# Altium footprint library Ultrascale_PcbLib.PcbLib: 132 footprints (part 5 of 9)
Each footprint in its own frame and in the unit in brackets; x right, y up, seen from the top. Pads: shape width x height; smd on the part's side, far side on the other; paste and mask are expansions set on the pad; w line width, h text height; cw(c..) or ccw(c..) is an arc to the next point about the centre after c.
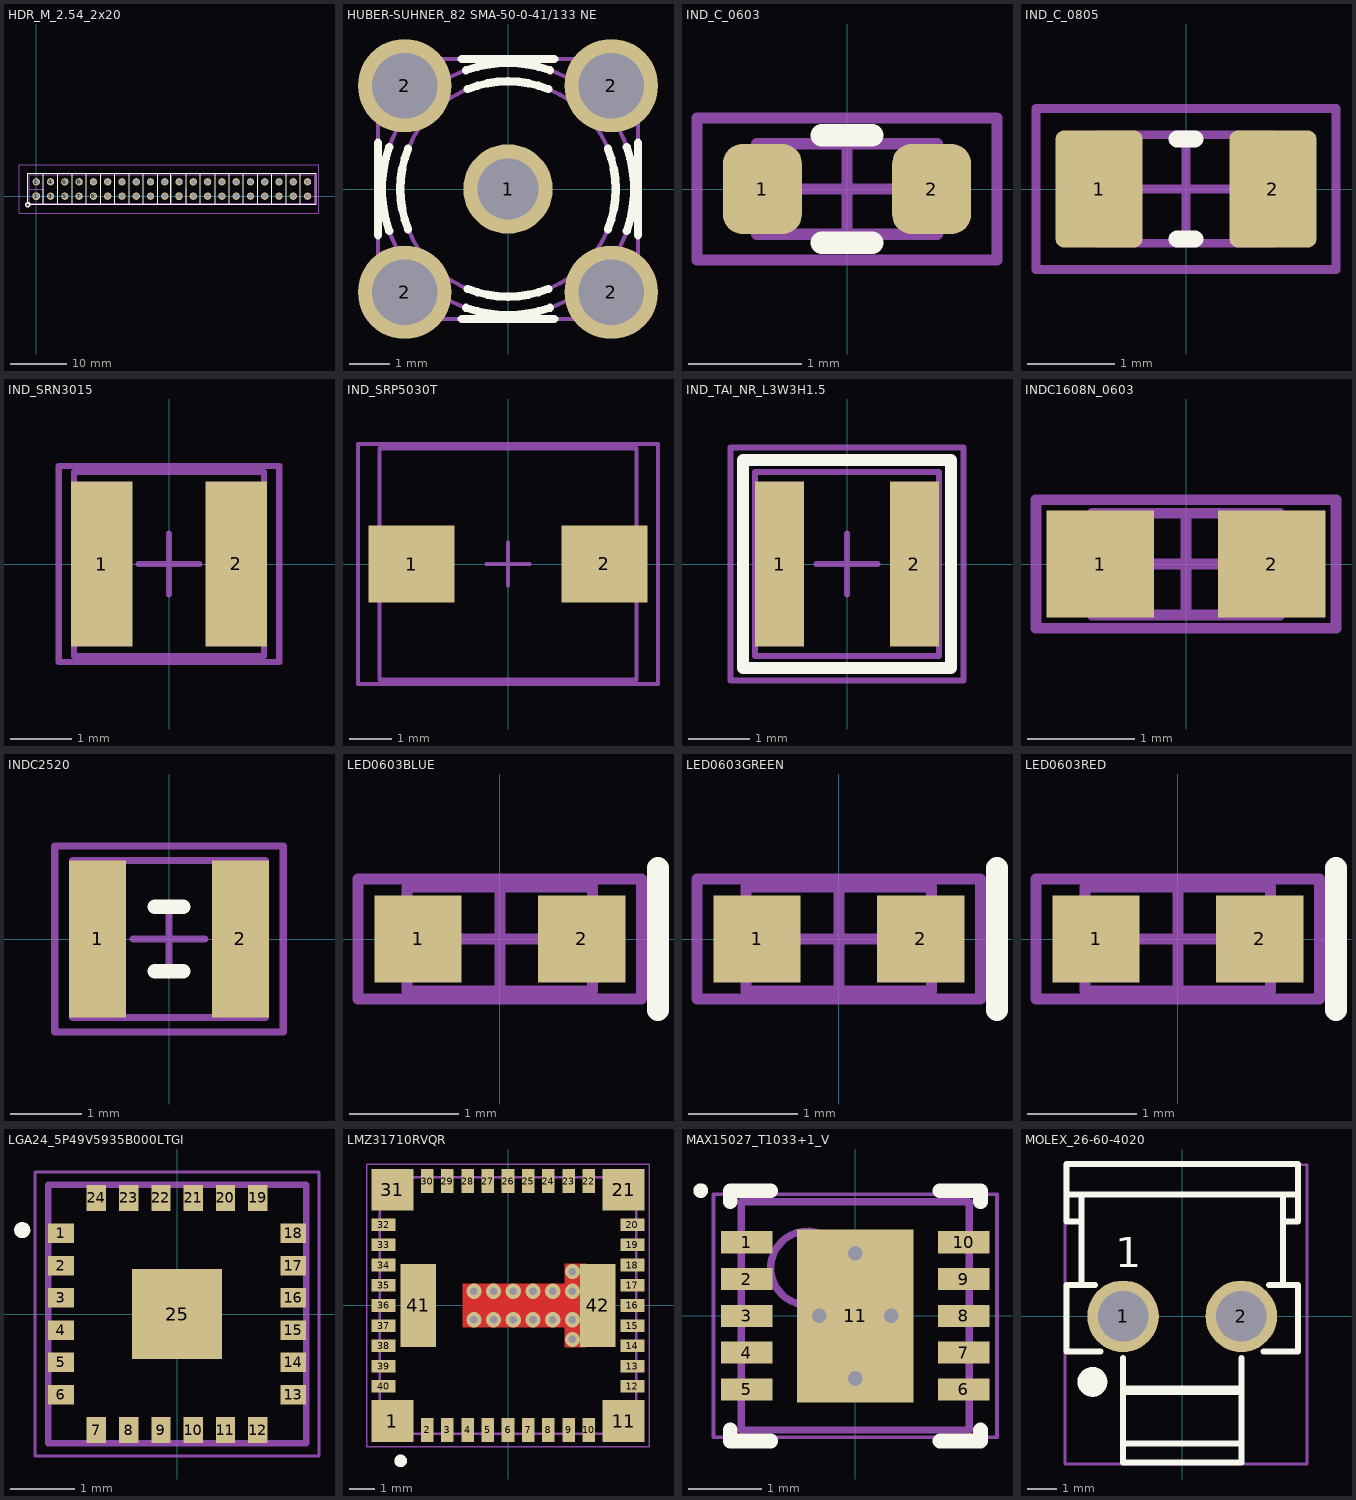
[diagram p4: the footprints below, top view; thin cyan lines are the x and y axes]

## HDR_M_2.54_2x20 [mil] "Header Male Vertical Dual Row 20 Way 2.54mm Pitch"
height 98.42
pads (40):
  oct 51x51 hole 36: 1(0,0) 21(1000,0)
  round 51 hole 36: 2(0,100) 3(100,0) 4(100,100) 5(200,0) 6(200,100) 7(300,0) 8(300,100) 9(400,0) 10(400,100) 11(500,0) 12(500,100) 13(600,0) 14(600,100) 15(700,0) 16(700,100) 17(800,0) 18(800,100) 19(900,0) 20(900,100) 22(1000,100) 23(1100,0) 24(1100,100) 25(1200,0) 26(1200,100) 27(1300,0) 28(1300,100) 29(1400,0) 30(1400,100) 31(1500,0) 32(1500,100) 33(1600,0) 34(1600,100) 35(1700,0) 36(1700,100) 37(1800,0) 38(1800,100) 39(1900,0) 40(1900,100)
Top Overlay:
  circle w10: c-60,-60 r14.33
  lines w7.87: 50,-55 50,155 ; 150,-55 150,155 ; 250,-55 250,155 ; 350,-55 350,155 ; 450,-55 450,155 ; 550,-55 550,155 ; 650,-55 650,155 ; 750,-55 750,158 ; 850,-55 850,158 ; 960,-57.5 -45,-57.5 -60,-42.5 -60,159.5 960,159.5 ; 1050,-55 1050,155 ; 1150,-55 1150,155 ; 1250,-55 1250,155 ; 1350,-55 1350,155 ; 1450,-55 1450,155 ; 1550,-55 1550,155 ; 1650,-55 1650,155 ; 1750,-55 1750,158 ; 1850,-55 1850,158 ; 940,-57.5 1960,-57.5 1960,159.5 940,159.5 940,-57.5
Mechanical 11:
  circle w5.91: c-55,-55 r7
  lines w3.94: -50,50 50,50 50,-50 ; -50,149 -50,-49 950,-49 ; -50,149.5 950,149.5 1950,149.5 ; 1050,-50 1050,50 ; 1950,149 1950,-49 950,-49 ; 950,-49 950,149 950,-49
Mechanical 15:
  lines w3.94: -121.06,220 -121.06,-120.08 1980,-120.08 1980,220.08 -121.06,220.08 ; -19.68,0 19.68,0 ; 0,-19.68 0,19.68 ; 980.32,0 1019.68,0 ; 1000,-19.68 1000,19.68
3D body: height 330, standoff 320, extent 1495,87.5 1505,97.5
3D body: height 330, standoff 320, extent 1487.5,95 1497.5,105
3D body: height 330, standoff 320, extent 1495,102.5 1505,112.5
3D body: height 330, standoff 320, extent 1502.5,95 1512.5,105
3D body: height 330, standoff 320, extent 1495,95 1505,105
3D body: height 320, standoff -130, extent 1487.5,87.5 1512.5,112.5
3D body: height 330, standoff 320, extent 1595,87.5 1605,97.5
3D body: height 330, standoff 320, extent 1587.5,95 1597.5,105
3D body: height 330, standoff 320, extent 1595,102.5 1605,112.5
3D body: height 330, standoff 320, extent 1602.5,95 1612.5,105
3D body: height 330, standoff 320, extent 1595,95 1605,105
3D body: height 320, standoff -130, extent 1587.5,87.5 1612.5,112.5
3D body: height 330, standoff 320, extent 1695,87.5 1705,97.5
3D body: height 330, standoff 320, extent 1687.5,95 1697.5,105
3D body: height 330, standoff 320, extent 1695,102.5 1705,112.5
3D body: height 330, standoff 320, extent 1702.5,95 1712.5,105
3D body: height 330, standoff 320, extent 1695,95 1705,105
3D body: height 320, standoff -130, extent 1687.5,87.5 1712.5,112.5
3D body: height 330, standoff 320, extent 1795,87.5 1805,97.5
3D body: height 330, standoff 320, extent 1787.5,95 1797.5,105
3D body: height 330, standoff 320, extent 1795,102.5 1805,112.5
3D body: height 330, standoff 320, extent 1802.5,95 1812.5,105
3D body: height 330, standoff 320, extent 1795,95 1805,105
3D body: height 320, standoff -130, extent 1787.5,87.5 1812.5,112.5
3D body: height 330, standoff 320, extent 1895,87.5 1905,97.5
3D body: height 330, standoff 320, extent 1887.5,95 1897.5,105
3D body: height 330, standoff 320, extent 1895,102.5 1905,112.5
3D body: height 330, standoff 320, extent 1902.5,95 1912.5,105
3D body: height 330, standoff 320, extent 1895,95 1905,105
3D body: height 320, standoff -130, extent 1887.5,87.5 1912.5,112.5
3D body: height 330, standoff 320, extent 995,87.5 1005,97.5
3D body: height 330, standoff 320, extent 987.5,95 997.5,105
3D body: height 330, standoff 320, extent 995,102.5 1005,112.5
3D body: height 330, standoff 320, extent 1002.5,95 1012.5,105
3D body: height 330, standoff 320, extent 995,95 1005,105
3D body: height 320, standoff -130, extent 987.5,87.5 1012.5,112.5
3D body: height 330, standoff 320, extent 1095,87.5 1105,97.5
3D body: height 330, standoff 320, extent 1087.5,95 1097.5,105
3D body: height 330, standoff 320, extent 1095,102.5 1105,112.5
3D body: height 330, standoff 320, extent 1102.5,95 1112.5,105
3D body: height 330, standoff 320, extent 1095,95 1105,105
3D body: height 320, standoff -130, extent 1087.5,87.5 1112.5,112.5
3D body: height 330, standoff 320, extent 1195,87.5 1205,97.5
3D body: height 330, standoff 320, extent 1187.5,95 1197.5,105
3D body: height 330, standoff 320, extent 1195,102.5 1205,112.5
3D body: height 330, standoff 320, extent 1202.5,95 1212.5,105
3D body: height 330, standoff 320, extent 1195,95 1205.01,105
3D body: height 320, standoff -130, extent 1187.5,87.5 1212.5,112.5
3D body: height 330, standoff 320, extent 1295,87.5 1305,97.5
3D body: height 330, standoff 320, extent 1287.5,95 1297.5,105
3D body: height 330, standoff 320, extent 1295,102.5 1305,112.5
3D body: height 330, standoff 320, extent 1302.5,95 1312.5,105
3D body: height 330, standoff 320, extent 1295,95 1305,105
3D body: height 320, standoff -130, extent 1287.5,87.5 1312.5,112.5
3D body: height 330, standoff 320, extent 1395,87.5 1405,97.5
3D body: height 330, standoff 320, extent 1387.5,95 1397.5,105
3D body: height 330, standoff 320, extent 1395,102.5 1405,112.5
3D body: height 330, standoff 320, extent 1402.5,95 1412.5,105
3D body: height 330, standoff 320, extent 1395,95 1405,105
3D body: height 320, standoff -130, extent 1387.5,87.5 1412.5,112.5
3D body: height 25, standoff 0, extent 1450,51 1475,149
3D body: height 100, standoff 25, extent 1450,50 1550.01,149
3D body: height 25, standoff 0, extent 1525,51 1550,149
3D body: height 25, standoff 0, extent 1550,51 1575,149
3D body: height 100, standoff 25, extent 1550,50 1650.01,149
3D body: height 25, standoff 0, extent 1625.01,51 1650,149
3D body: height 25, standoff 0, extent 1650,51 1675,149
3D body: height 100, standoff 25, extent 1650,50 1750.01,149
3D body: height 25, standoff 0, extent 1725.01,51 1750,149
3D body: height 25, standoff 0, extent 1750,51 1775,149
3D body: height 100, standoff 25, extent 1750,50 1850.01,149
3D body: height 25, standoff 0, extent 1825.01,51 1850,149
3D body: height 25, standoff 0, extent 1850,51 1875,149
3D body: height 100, standoff 25, extent 1850,50 1950.01,149
3D body: height 25, standoff 0, extent 1925.01,51 1950,149
3D body: height 25, standoff 0, extent 950,51 975,149
3D body: height 100, standoff 25, extent 950,50 1050.01,149
3D body: height 25, standoff 0, extent 1025.01,51 1050,149
3D body: height 25, standoff 0, extent 1050,51 1075,149
3D body: height 100, standoff 25, extent 1050,50 1150.01,149
3D body: height 25, standoff 0, extent 1125.01,51 1150,149
3D body: height 25, standoff 0, extent 1150,51 1175,149
3D body: height 100, standoff 25, extent 1150,50 1250.01,149
3D body: height 25, standoff 0, extent 1225.01,51 1250,149
3D body: height 25, standoff 0, extent 1250,51 1275,149
3D body: height 100, standoff 25, extent 1250,50 1350.01,149
3D body: height 25, standoff 0, extent 1325.01,51 1350,149
3D body: height 25, standoff 0, extent 1350,51 1375,149
3D body: height 100, standoff 25, extent 1350,50 1450.01,149
3D body: height 25, standoff 0, extent 1425.01,51 1450,149
3D body: height 330, standoff 320, extent 1495,-12.5 1505,-2.5
3D body: height 330, standoff 320, extent 1487.5,-5 1497.5,5
3D body: height 330, standoff 320, extent 1495,2.5 1505,12.5
3D body: height 330, standoff 320, extent 1502.5,-5 1512.5,5
3D body: height 330, standoff 320, extent 1495,-5 1505,5
3D body: height 25, standoff 0, extent 1450,-49 1475,49
3D body: height 100, standoff 25, extent 1450,-48.99 1550.01,50
3D body: height 25, standoff 0, extent 1525,-49 1550,49
3D body: height 320, standoff -130, extent 1487.5,-12.5 1512.5,12.5
3D body: height 330, standoff 320, extent 1595,-12.5 1605,-2.5
3D body: height 330, standoff 320, extent 1587.5,-5 1597.5,5
3D body: height 330, standoff 320, extent 1595,2.5 1605,12.5
3D body: height 330, standoff 320, extent 1602.5,-5 1612.5,5
3D body: height 330, standoff 320, extent 1595,-5 1605,5
3D body: height 25, standoff 0, extent 1550,-49 1575,49
3D body: height 100, standoff 25, extent 1550,-48.99 1650.01,50
3D body: height 25, standoff 0, extent 1625,-49 1650,49
3D body: height 320, standoff -130, extent 1587.5,-12.5 1612.5,12.5
3D body: height 330, standoff 320, extent 1695,-12.5 1705,-2.5
3D body: height 330, standoff 320, extent 1687.5,-5 1697.5,5
3D body: height 330, standoff 320, extent 1695,2.5 1705,12.5
3D body: height 330, standoff 320, extent 1702.5,-5 1712.5,5
3D body: height 330, standoff 320, extent 1695,-5 1705,5
3D body: height 25, standoff 0, extent 1650,-49 1675,49
3D body: height 100, standoff 25, extent 1650,-48.99 1750.01,50
3D body: height 25, standoff 0, extent 1725,-49 1750,49
3D body: height 320, standoff -130, extent 1687.5,-12.5 1712.5,12.5
3D body: height 330, standoff 320, extent 1795,-12.5 1805,-2.5
3D body: height 330, standoff 320, extent 1787.5,-5 1797.5,5
3D body: height 330, standoff 320, extent 1795,2.5 1805,12.5
3D body: height 330, standoff 320, extent 1802.5,-5 1812.5,5
3D body: height 330, standoff 320, extent 1795,-5 1805,5
3D body: height 25, standoff 0, extent 1750,-49 1775,49
3D body: height 100, standoff 25, extent 1750,-48.99 1850.01,50
3D body: height 25, standoff 0, extent 1825,-49 1850,49
3D body: height 320, standoff -130, extent 1787.5,-12.5 1812.5,12.5
3D body: height 330, standoff 320, extent 1895,-12.5 1905,-2.5
3D body: height 330, standoff 320, extent 1887.5,-5 1897.5,5
3D body: height 330, standoff 320, extent 1895,2.5 1905,12.5
3D body: height 330, standoff 320, extent 1902.5,-5 1912.5,5
3D body: height 330, standoff 320, extent 1895,-5 1905,5
3D body: height 25, standoff 0, extent 1850,-49 1875,49
3D body: height 100, standoff 25, extent 1850,-48.99 1950.01,50
3D body: height 25, standoff 0, extent 1925,-49 1950,49
3D body: height 320, standoff -130, extent 1887.5,-12.5 1912.5,12.5
3D body: height 330, standoff 320, extent 995,-12.5 1005,-2.5
3D body: height 330, standoff 320, extent 987.5,-5 997.5,5
3D body: height 330, standoff 320, extent 995,2.5 1005,12.5
3D body: height 330, standoff 320, extent 1002.5,-5 1012.5,5
3D body: height 330, standoff 320, extent 995,-5 1005,5
3D body: height 25, standoff 0, extent 950,-49 975,49
3D body: height 100, standoff 25, extent 950,-48.99 1050.01,50
3D body: height 25, standoff 0, extent 1025,-49 1050,49
3D body: height 320, standoff -130, extent 987.5,-12.5 1012.5,12.5
3D body: height 330, standoff 320, extent 1095,-12.5 1105,-2.5
3D body: height 330, standoff 320, extent 1087.5,-5 1097.5,5
3D body: height 330, standoff 320, extent 1095,2.5 1105,12.5
3D body: height 330, standoff 320, extent 1102.5,-5 1112.5,5
3D body: height 330, standoff 320, extent 1095,-5 1105,5
3D body: height 25, standoff 0, extent 1050,-49 1075,49
3D body: height 100, standoff 25, extent 1050,-48.99 1150.01,50
3D body: height 25, standoff 0, extent 1125,-49 1150,49
3D body: height 320, standoff -130, extent 1087.5,-12.5 1112.5,12.5
3D body: height 330, standoff 320, extent 1195,-12.5 1205,-2.5
3D body: height 330, standoff 320, extent 1187.5,-5 1197.5,5
3D body: height 330, standoff 320, extent 1195,2.5 1205,12.5
3D body: height 330, standoff 320, extent 1202.5,-5 1212.5,5
3D body: height 330, standoff 320, extent 1195,-5 1205,5
3D body: height 25, standoff 0, extent 1150,-49 1175,49
3D body: height 100, standoff 25, extent 1150,-48.99 1250.01,50
3D body: height 25, standoff 0, extent 1225,-49 1250,49
3D body: height 320, standoff -130, extent 1187.5,-12.5 1212.5,12.5
3D body: height 330, standoff 320, extent 1295,-12.5 1305,-2.5
3D body: height 330, standoff 320, extent 1287.5,-5 1297.5,5
3D body: height 330, standoff 320, extent 1295,2.5 1305,12.5
3D body: height 330, standoff 320, extent 1302.5,-5 1312.5,5
3D body: height 330, standoff 320, extent 1295,-5 1305,5
3D body: height 25, standoff 0, extent 1250,-49 1275,49
3D body: height 100, standoff 25, extent 1250,-48.99 1350.01,50
3D body: height 25, standoff 0, extent 1325,-49 1350,49
3D body: height 320, standoff -130, extent 1287.5,-12.5 1312.5,12.5
3D body: height 330, standoff 320, extent 1395,-12.5 1405,-2.5
3D body: height 330, standoff 320, extent 1387.5,-5 1397.5,5
3D body: height 330, standoff 320, extent 1395,2.5 1405,12.5
3D body: height 330, standoff 320, extent 1402.5,-5 1412.5,5
3D body: height 330, standoff 320, extent 1395,-5 1405,5
3D body: height 25, standoff 0, extent 1350,-49 1375,49
3D body: height 100, standoff 25, extent 1350,-48.99 1450.01,50
3D body: height 25, standoff 0, extent 1425,-49 1450,49
3D body: height 320, standoff -130, extent 1387.5,-12.5 1412.5,12.5
3D body: height 320, standoff -130, extent 387.5,-12.5 412.5,12.5
3D body: height 25, standoff 0, extent 425,-49 450,49
3D body: height 100, standoff 25, extent 350,-48.99 450.01,50
3D body: height 25, standoff 0, extent 350,-49 375,49
3D body: height 330, standoff 320, extent 395,-5 405,5
3D body: height 330, standoff 320, extent 402.5,-5 412.5,5
3D body: height 330, standoff 320, extent 395,2.5 405,12.5
3D body: height 330, standoff 320, extent 387.5,-5 397.5,5
3D body: height 330, standoff 320, extent 395,-12.5 405,-2.5
3D body: height 320, standoff -130, extent 287.5,-12.5 312.5,12.5
3D body: height 25, standoff 0, extent 325,-49 350,49
3D body: height 100, standoff 25, extent 250,-48.99 350.01,50
3D body: height 25, standoff 0, extent 250,-49 275,49
3D body: height 330, standoff 320, extent 295,-5 305,5
3D body: height 330, standoff 320, extent 302.5,-5 312.5,5
3D body: height 330, standoff 320, extent 295,2.5 305,12.5
3D body: height 330, standoff 320, extent 287.5,-5 297.5,5
3D body: height 330, standoff 320, extent 295,-12.5 305,-2.5
3D body: height 320, standoff -130, extent 187.5,-12.5 212.5,12.5
3D body: height 25, standoff 0, extent 225,-49 250,49
3D body: height 100, standoff 25, extent 150,-48.99 250.01,50
3D body: height 25, standoff 0, extent 150,-49 175,49
3D body: height 330, standoff 320, extent 195,-5 205,5
3D body: height 330, standoff 320, extent 202.5,-5 212.5,5
3D body: height 330, standoff 320, extent 195,2.5 205,12.5
3D body: height 330, standoff 320, extent 187.5,-5 197.5,5
3D body: height 330, standoff 320, extent 195,-12.5 205,-2.5
3D body: height 320, standoff -130, extent 87.5,-12.5 112.5,12.5
3D body: height 25, standoff 0, extent 125,-49 150,49
3D body: height 100, standoff 25, extent 50,-48.99 150.01,50
3D body: height 25, standoff 0, extent 50,-49 75,49
3D body: height 330, standoff 320, extent 95,-5 105,5
3D body: height 330, standoff 320, extent 102.5,-5 112.5,5
3D body: height 330, standoff 320, extent 95,2.5 105,12.5
3D body: height 330, standoff 320, extent 87.5,-5 97.5,5
3D body: height 330, standoff 320, extent 95,-12.5 105,-2.5
3D body: height 320, standoff -130, extent -12.5,-12.5 12.5,12.5
3D body: height 25, standoff 0, extent 25,-49 50,49
3D body: height 100, standoff 25, extent -50,-48.99 50.01,50
3D body: height 25, standoff 0, extent -50,-49 -25,49
3D body: height 330, standoff 320, extent -5,-5 5,5
3D body: height 330, standoff 320, extent 2.5,-5 12.5,5
3D body: height 330, standoff 320, extent -5,2.5 5,12.5
3D body: height 330, standoff 320, extent -12.5,-5 -2.5,5
3D body: height 330, standoff 320, extent -5,-12.5 5,-2.5
3D body: height 320, standoff -130, extent 887.5,-12.5 912.5,12.5
3D body: height 25, standoff 0, extent 925,-49 950,49
3D body: height 100, standoff 25, extent 850,-48.99 950.01,50
3D body: height 25, standoff 0, extent 850,-49 875,49
3D body: height 330, standoff 320, extent 895,-5 905,5
3D body: height 330, standoff 320, extent 902.5,-5 912.5,5
3D body: height 330, standoff 320, extent 895,2.5 905,12.5
3D body: height 330, standoff 320, extent 887.5,-5 897.5,5
3D body: height 330, standoff 320, extent 895,-12.5 905,-2.5
3D body: height 320, standoff -130, extent 787.5,-12.5 812.5,12.5
3D body: height 25, standoff 0, extent 825,-49 850,49
3D body: height 100, standoff 25, extent 750,-48.99 850.01,50
3D body: height 25, standoff 0, extent 750,-49 775,49
3D body: height 330, standoff 320, extent 795,-5 805,5
3D body: height 330, standoff 320, extent 802.5,-5 812.5,5
3D body: height 330, standoff 320, extent 795,2.5 805,12.5
3D body: height 330, standoff 320, extent 787.5,-5 797.5,5
3D body: height 330, standoff 320, extent 795,-12.5 805,-2.5
3D body: height 320, standoff -130, extent 687.5,-12.5 712.5,12.5
3D body: height 25, standoff 0, extent 725,-49 750,49
3D body: height 100, standoff 25, extent 650,-48.99 750.01,50
3D body: height 25, standoff 0, extent 650,-49 675,49
3D body: height 330, standoff 320, extent 695,-5 705,5
3D body: height 330, standoff 320, extent 702.5,-5 712.5,5
3D body: height 330, standoff 320, extent 695,2.5 705,12.5
3D body: height 330, standoff 320, extent 687.5,-5 697.5,5
3D body: height 330, standoff 320, extent 695,-12.5 705,-2.5
3D body: height 320, standoff -130, extent 587.5,-12.5 612.5,12.5
3D body: height 25, standoff 0, extent 625,-49 650,49
3D body: height 100, standoff 25, extent 550,-48.99 650.01,50
3D body: height 25, standoff 0, extent 550,-49 575,49
3D body: height 330, standoff 320, extent 595,-5 605,5
3D body: height 330, standoff 320, extent 602.5,-5 612.5,5
3D body: height 330, standoff 320, extent 595,2.5 605,12.5
3D body: height 330, standoff 320, extent 587.5,-5 597.5,5
3D body: height 330, standoff 320, extent 595,-12.5 605,-2.5
3D body: height 320, standoff -130, extent 487.5,-12.5 512.5,12.5
3D body: height 25, standoff 0, extent 525,-49 550,49
3D body: height 100, standoff 25, extent 450,-48.99 550.01,50
3D body: height 25, standoff 0, extent 450,-49 475,49
3D body: height 330, standoff 320, extent 495,-5 505,5
3D body: height 330, standoff 320, extent 502.5,-5 512.5,5
3D body: height 330, standoff 320, extent 495,2.5 505,12.5
3D body: height 330, standoff 320, extent 487.5,-5 497.5,5
3D body: height 330, standoff 320, extent 495,-12.5 505,-2.5
3D body: height 25, standoff 0, extent 425,51 450,149
3D body: height 100, standoff 25, extent 350,50 450.01,149
3D body: height 25, standoff 0, extent 350,51 375,149
3D body: height 25, standoff 0, extent 325,51 350,149
3D body: height 100, standoff 25, extent 250,50 350.01,149
3D body: height 25, standoff 0, extent 250,51 275,149
3D body: height 25, standoff 0, extent 225,51 250,149
3D body: height 100, standoff 25, extent 150,50 250.01,149
3D body: height 25, standoff 0, extent 150,51 175,149
3D body: height 25, standoff 0, extent 125,51 150,149
3D body: height 100, standoff 25, extent 50,50 150.01,149
3D body: height 25, standoff 0, extent 50,51 75,149
3D body: height 25, standoff 0, extent 25,51 50,149
3D body: height 100, standoff 25, extent -50,50 50.01,149
3D body: height 25, standoff 0, extent -50,51 -25,149
3D body: height 25, standoff 0, extent 925,51 950,149
3D body: height 100, standoff 25, extent 850,50 950.01,149
3D body: height 25, standoff 0, extent 850,51 875,149
3D body: height 25, standoff 0, extent 825,51 850,149
3D body: height 100, standoff 25, extent 750,50 850.01,149
3D body: height 25, standoff 0, extent 750,51 775,149
3D body: height 25, standoff 0, extent 725,51 750,149
3D body: height 100, standoff 25, extent 650,50 750.01,149
3D body: height 25, standoff 0, extent 650,51 675,149
3D body: height 25, standoff 0, extent 625,51 650,149
3D body: height 100, standoff 25, extent 550,50 650.01,149
3D body: height 25, standoff 0, extent 550,51 575,149
3D body: height 25, standoff 0, extent 525,51 550,149
3D body: height 100, standoff 25, extent 450,50 550.01,149
3D body: height 25, standoff 0, extent 450,51 475,149
3D body: height 320, standoff -130, extent 387.5,87.5 412.5,112.5
3D body: height 330, standoff 320, extent 395,95 405,105
3D body: height 330, standoff 320, extent 402.5,95 412.5,105
3D body: height 330, standoff 320, extent 395,102.5 405,112.5
3D body: height 330, standoff 320, extent 387.5,95 397.5,105
3D body: height 330, standoff 320, extent 395,87.5 405,97.5
3D body: height 320, standoff -130, extent 287.5,87.5 312.5,112.5
3D body: height 330, standoff 320, extent 295,95 305,105
3D body: height 330, standoff 320, extent 302.5,95 312.5,105
3D body: height 330, standoff 320, extent 295,102.5 305,112.5
3D body: height 330, standoff 320, extent 287.5,95 297.5,105
3D body: height 330, standoff 320, extent 295,87.5 305,97.5
3D body: height 320, standoff -130, extent 187.5,87.5 212.5,112.5
3D body: height 330, standoff 320, extent 195,95 205,105
3D body: height 330, standoff 320, extent 202.5,95 212.5,105
3D body: height 330, standoff 320, extent 195,102.5 205,112.5
3D body: height 330, standoff 320, extent 187.5,95 197.5,105
3D body: height 330, standoff 320, extent 195,87.5 205,97.5
3D body: height 320, standoff -130, extent 87.5,87.5 112.5,112.5
3D body: height 330, standoff 320, extent 95,95 105,105
3D body: height 330, standoff 320, extent 102.5,95 112.5,105
3D body: height 330, standoff 320, extent 95,102.5 105,112.5
3D body: height 330, standoff 320, extent 87.5,95 97.5,105
3D body: height 330, standoff 320, extent 95,87.5 105,97.5
3D body: height 320, standoff -130, extent -12.5,87.5 12.5,112.5
3D body: height 330, standoff 320, extent -5,95 5,105
3D body: height 330, standoff 320, extent 2.5,95 12.5,105
3D body: height 330, standoff 320, extent -5,102.5 5,112.5
3D body: height 330, standoff 320, extent -12.5,95 -2.5,105
3D body: height 330, standoff 320, extent -5,87.5 5,97.5
3D body: height 320, standoff -130, extent 887.5,87.5 912.5,112.5
3D body: height 330, standoff 320, extent 895,95 905,105
3D body: height 330, standoff 320, extent 902.5,95 912.5,105
3D body: height 330, standoff 320, extent 895,102.5 905,112.5
3D body: height 330, standoff 320, extent 887.5,95 897.5,105
3D body: height 330, standoff 320, extent 895,87.5 905,97.5
3D body: height 320, standoff -130, extent 787.5,87.5 812.5,112.5
3D body: height 330, standoff 320, extent 795,95 805,105
3D body: height 330, standoff 320, extent 802.5,95 812.5,105
3D body: height 330, standoff 320, extent 795,102.5 805,112.5
3D body: height 330, standoff 320, extent 787.5,95 797.5,105
3D body: height 330, standoff 320, extent 795,87.5 805,97.5
3D body: height 320, standoff -130, extent 687.5,87.5 712.5,112.5
3D body: height 330, standoff 320, extent 695,95 705,105
3D body: height 330, standoff 320, extent 702.5,95 712.5,105
3D body: height 330, standoff 320, extent 695,102.5 705,112.5
3D body: height 330, standoff 320, extent 687.5,95 697.5,105
3D body: height 330, standoff 320, extent 695,87.5 705,97.5
3D body: height 320, standoff -130, extent 587.5,87.5 612.5,112.5
3D body: height 330, standoff 320, extent 595,95 605,105
3D body: height 330, standoff 320, extent 602.5,95 612.5,105
3D body: height 330, standoff 320, extent 595,102.5 605,112.5
3D body: height 330, standoff 320, extent 587.5,95 597.5,105
3D body: height 330, standoff 320, extent 595,87.5 605,97.5
3D body: height 320, standoff -130, extent 487.5,87.5 512.5,112.5
3D body: height 330, standoff 320, extent 495,95 505,105
3D body: height 330, standoff 320, extent 502.5,95 512.5,105
3D body: height 330, standoff 320, extent 495,102.5 505,112.5
3D body: height 330, standoff 320, extent 487.5,95 497.5,105
3D body: height 330, standoff 320, extent 495,87.5 505,97.5

## HUBER-SUHNER_82 SMA-50-0-41/133 NE [mm] "50 Ohm SMA Straight PCB Jack"
height 9.5
pads (5):
  round 2.2 hole 1.5: 1(0,0)
  round 2.3 hole 1.6: 2(-2.54,-2.54) 2(-2.54,2.54) 2(2.54,-2.54) 2(2.54,2.54)
Top Overlay:
  lines w0.2: -3.2,-1.138 -3.2,1.138 ; -2.921,-1.038 cw(c0,0) -2.921,1.038 ; -2.457,-0.992 cw(c0,0) -2.457,0.992 ; -1.138,-3.2 1.138,-3.2 ; -1.138,3.2 1.138,3.2 ; -1.038,-2.921 ccw(c0,0) 1.038,-2.921 ; -1.038,2.921 cw(c0,0) 1.038,2.921 ; -0.992,-2.457 ccw(c0,0) 0.992,-2.457 ; -0.992,2.457 cw(c0,0) 0.992,2.457 ; 2.457,-0.992 ccw(c0,0) 2.457,0.992 ; 2.921,-1.038 ccw(c0,0) 2.921,1.038 ; 3.2,-1.138 3.2,1.138
Mechanical 8:
  lines w0.1: -3.54,-2.54 -2.54,-2.54 ; -3.54,2.54 -2.54,2.54 ; -2.54,-3.54 -2.54,-2.54 ; -2.54,-1.54 -2.54,-2.54 ; -2.54,1.54 -2.54,2.54 ; -2.54,3.54 -2.54,2.54 ; -1.54,-2.54 -2.54,-2.54 ; -1.54,2.54 -2.54,2.54 ; -1,0 0,0 ; 0,-1 0,0 ; 0,1 0,0 ; 1,0 0,0 ; 1.54,-2.54 2.54,-2.54 ; 1.54,2.54 2.54,2.54 ; 2.54,-3.54 2.54,-2.54 ; 2.54,-1.54 2.54,-2.54 ; 2.54,1.54 2.54,2.54 ; 2.54,3.54 2.54,2.54 ; 3.54,-2.54 2.54,-2.54 ; 3.54,2.54 2.54,2.54
Mechanical 14:
  circle w0.1: c0,0 r3.1
  circle w0.1: c0,0 r2.65
  circle w0.1: c0,0 r0.5
  lines w0.1: -3.2,-3.2 3.2,-3.2 3.2,3.2 -3.2,3.2 -3.2,-3.2
3D body "HUBER-SUHNER_82 SMA-50-0-41-133 NE.stp": height 9.5, standoff -4, extent -3.2,-3.2 3.2,3.2

## IND_C_0603 [mm] "Chip Inductor 2-Leads, Body 1.6x0.8mm, IPC Medium Density"
height 0.55
pads (2):
  rrect50% 0.7x0.8 smd: 1(-0.75,0) 2(0.75,0)
Top Overlay:
  lines w0.2: -0.225,-0.475 0.225,-0.475 ; -0.225,0.475 0.225,0.475
Mechanical 11:
  lines w0.1: -1.33,-0.63 -1.33,0.63 1.33,0.63 1.33,-0.63 -1.33,-0.63
Mechanical 13:
  lines w0.1: -0.8,-0.4 -0.8,0.4 0.8,0.4 0.8,-0.4 -0.8,-0.4
Mechanical 15:
  lines w0.1: -0.4,0 0.4,0 ; 0,-0.4 0,0.4 ; -1.33,-0.63 1.33,-0.63 1.33,0.63 -1.33,0.63 -1.33,-0.63
3D body: height 0, standoff 0, extent -1.325,-0.625 1.325,0.625
3D body "Ind_0603.stp": height 0.81, standoff -0.03, extent -0.8,-0.42 0.8,0.421

## IND_C_0805 [mm] "Chip Inductor, 2-Leads, Body 2.0x1.3mm, IPC Medium Density"
height 0.9
pads (2):
  rrect20% 1x1.35 smd: 1(-1,0) 2(1,0)
Top Overlay:
  lines w0.2: -0.1,-0.575 0.1,-0.575 ; -0.1,0.575 0.1,0.575
Mechanical 11:
  lines w0.1: -1.725,-0.925 1.725,-0.925 1.725,0.925 -1.725,0.925 -1.725,-0.925
Mechanical 13:
  lines w0.1: -1,-0.625 -1,0.625 1,0.625 1,-0.625 -1,-0.625
Mechanical 15:
  lines w0.1: -0.5,0 0.5,0 ; 0,-0.5 0,0.5 ; -1.725,-0.925 -1.725,0.925 1.725,0.925 1.725,-0.925 -1.725,-0.925
3D body "IND_C_0805.step": height 0.95, standoff 0, extent -1,-0.6 1,0.6

## IND_SRN3015 [mm] "Bourns Inc., SRN3015 Series, Body 3.0x3.0mm"
height 1.5
pads (2):
  rect 1x2.7 smd: 1(-1.1,0) 2(1.1,0)
Mechanical 13:
  lines w0.1: -1.55,-1.5 -1.55,1.5 1.55,1.5 1.55,-1.5 -1.55,-1.5
Mechanical 15:
  lines w0.1: -0.5,0 0.5,0 ; 0,-0.5 0,0.5 ; -1.8,-1.6 -1.8,1.6 1.8,1.6 1.8,-1.6 -1.8,-1.6
3D body: height 1.5, standoff 0, extent -1.55,-1.5 1.55,1.5

## IND_SRP5030T [mm] "Bourns Inc., SRP5030T Series, Body 5.7x5.2mm"
height 3
pads (2):
  rect 2x1.8 smd: 1(-2.25,0) 2(2.25,0)
Mechanical 13:
  lines w0.1: -3,-2.7 3,-2.7 3,2.7 -3,2.7 -3,-2.7
Mechanical 15:
  lines w0.1: -0.5,0 0.5,0 ; 0,-0.5 0,0.5 ; -3.5,-2.8 3.5,-2.8 3.5,2.8 -3.5,2.8 -3.5,-2.8
3D body: height 3, standoff 0, extent -3,-2.7 3,2.7

## IND_TAI_NR_L3W3H1.5 [mm]
pads (2):
  rect 0.8x2.7 smd: 1(-1.1,0) 2(1.1,0)
Top Overlay:
  lines w0.2: -1.7,-1.7 1.7,-1.7 1.7,1.7 -1.7,1.7 -1.7,-1.7
Mechanical 11:
  lines w0.1: -1.5,-1.5 -1.5,1.5 1.5,1.5 1.5,-1.5 -1.5,-1.5
Mechanical 15:
  lines w0.1: -0.5,0 0.5,0 ; 0,-0.5 0,0.5 ; -1.9,-1.9 1.9,-1.9 1.9,1.9 -1.9,1.9 -1.9,-1.9
3D body "User Library-nr3015.STEP": height 1.4, standoff -0.1, extent -1.5,-1.5 1.5,1.5

## INDC1608N_0603 [mm] "Chip Inductor, Body 1.6x0.8mm, IPC Medium Density"
height 0.71
pads (2):
  rect 1x1 smd: 1(-0.8,0) 2(0.8,0)
Mechanical 13:
  lines w0.1: -0.875,-0.475 0.875,-0.475 0.875,0.475 -0.875,0.475 -0.875,-0.475
Mechanical 15:
  lines w0.1: -0.475,0 0.475,0 ; 0,-0.475 0,0.475 ; -1.4,-0.6 1.4,-0.6 1.4,0.6 -1.4,0.6 -1.4,-0.6
3D body: height 0.71, standoff 0, extent -0.875,-0.475 0.875,0.475

## INDC2520 [mm] "Chip Inductor, Body 2.5x2.0mm"
height 1.2
pads (2):
  rect 0.8x2.2 smd: 1(-1,0) 2(1,0)
Top Overlay:
  lines w0.2: -0.2,-0.45 0.2,-0.45 ; -0.2,0.45 0.2,0.45
Mechanical 13:
  lines w0.1: -1.35,-1.1 -1.35,1.1 1.35,1.1 1.35,-1.1 -1.35,-1.1
Mechanical 15:
  lines w0.1: -0.5,0 0.5,0 ; 0,-0.5 0,0.5 ; -1.6,-1.3 -1.6,1.3 1.6,1.3 1.6,-1.3 -1.6,-1.3
3D body "IHHP-1008AB-01.STEP": height 1.17, standoff -0.03, extent -1.244,-1.003 1.245,1.003

## LED0603BLUE [mm] "1.6x0.8mm LED"
height 0.8
pads (2):
  rect 0.8x0.8 smd: 1(-0.75,0) 2(0.75,0)
Top Overlay:
  lines w0.2: 1.45,-0.65 1.45,0.65
Mechanical 13:
  lines w0.1: -0.85,-0.475 -0.85,0.475 0.85,0.475 0.85,-0.475 -0.85,-0.475
Mechanical 15:
  lines w0.1: -0.475,0 0.475,0 ; 0,-0.475 0,0.475 ; -1.3,-0.55 -1.3,0.55 1.3,0.55 1.3,-0.55 -1.3,-0.55
3D body "led_0603LED0603 blue.STEP": height 0.6, standoff 0, extent -0.81,-0.4 0.81,0.4

## LED0603GREEN [mm] "1.6x0.8mm LED"
height 0.8
pads (2):
  rect 0.8x0.8 smd: 1(-0.75,0) 2(0.75,0)
Top Overlay:
  lines w0.2: 1.45,-0.65 1.45,0.65
Mechanical 13:
  lines w0.1: -0.85,-0.475 0.85,-0.475 0.85,0.475 -0.85,0.475 -0.85,-0.475
Mechanical 15:
  lines w0.1: -0.475,0 0.475,0 ; 0,-0.475 0,0.475 ; -1.3,-0.55 1.3,-0.55 1.3,0.55 -1.3,0.55 -1.3,-0.55
3D body "led_0603LED0603 green.STEP": height 0.6, standoff 0, extent -0.81,-0.4 0.81,0.4

## LED0603RED [mm] "1.6x0.8mm LED"
height 0.8
pads (2):
  rect 0.8x0.8 smd: 1(-0.75,0) 2(0.75,0)
Top Overlay:
  lines w0.2: 1.45,-0.65 1.45,0.65
Mechanical 13:
  lines w0.1: -0.85,-0.475 0.85,-0.475 0.85,0.475 -0.85,0.475 -0.85,-0.475
Mechanical 15:
  lines w0.1: -0.475,0 0.475,0 ; 0,-0.475 0,0.475 ; -1.3,-0.55 1.3,-0.55 1.3,0.55 -1.3,0.55 -1.3,-0.55
3D body "led_0603LED0603 red.STEP": height 0.6, standoff 0, extent -0.81,-0.4 0.81,0.4

## LGA24_5P49V5935B000LTGI [mm] "IDT, IC CLOCK GENERATOR 24LGA, 4mmx4mm"
height 1.49
pads (25):
  rect 0.4x0.3 smd mask+0.05: 1(-1.8,1.25) 2(-1.8,0.75) 3(-1.8,0.25) 4(-1.8,-0.25) 5(-1.8,-0.75) 6(-1.8,-1.25) 13(1.8,-1.25) 14(1.8,-0.75) 15(1.8,-0.25) 16(1.8,0.25) 17(1.8,0.75) 18(1.8,1.25)
  rect 0.3x0.4 smd mask+0.05: 7(-1.25,-1.8) 8(-0.75,-1.8) 9(-0.25,-1.8) 10(0.25,-1.8) 11(0.75,-1.8) 12(1.25,-1.8) 19(1.25,1.8) 20(0.75,1.8) 21(0.25,1.8) 22(-0.25,1.8) 23(-0.75,1.8) 24(-1.25,1.8)
  rect 1.4x1.4 smd mask+0.05: 25(0,0)
Top Overlay:
  circle w0.15: c-2.4,1.3 r0.05
Mechanical 13:
  lines w0.1: -2,-2 -2,2 2,2 2,-2 -2,-2
Mechanical 15:
  lines w0.05: -2.2,-2.2 -2.2,2.2 2.2,2.2 2.2,-2.2 -2.2,-2.2
  lines w0.1: -0.5,0 0.5,0 ; 0,-0.5 0,0.5
3D body: height 1.49, standoff 0, extent -2,-2 2,2
3D body: height 1.5, standoff 1.49, extent -1.55,1.05 -1.05,1.55

## LMZ31710RVQR [mm] "TI RVQ PAckage Regulator"
height 4.4
pads (42):
  rect 1.65x1.65 smd paste-0.225 mask+0.05: 1(-4.575,-4.575) 11(4.575,-4.575) 21(4.575,4.575) 31(-4.575,4.575)
  rect 0.5x0.95 smd paste-0.05 mask+0.05: 2(-3.2,-4.925) 3(-2.4,-4.925) 4(-1.6,-4.925) 5(-0.8,-4.925) 6(0,-4.925) 7(0.8,-4.925) 8(1.6,-4.925) 9(2.4,-4.925) 10(3.2,-4.925) 22(3.2,4.925) 23(2.4,4.925) 24(1.6,4.925) 25(0.8,4.925) 26(0,4.925) 27(-0.8,4.925) 28(-1.6,4.925) 29(-2.4,4.925) 30(-3.2,4.925)
  rect 0.95x0.5 smd paste-0.05 mask+0.05: 12(4.925,-3.2) 13(4.925,-2.4) 14(4.925,-1.6) 15(4.925,-0.8) 16(4.925,0) 17(4.925,0.8) 18(4.925,1.6) 19(4.925,2.4) 20(4.925,3.2) 32(-4.925,3.2) 33(-4.925,2.4) 34(-4.925,1.6) 35(-4.925,0.8) 36(-4.925,0) 37(-4.925,-0.8) 38(-4.925,-1.6) 39(-4.925,-2.4) 40(-4.925,-3.2)
  rect 1.4x3.29 smd paste-5 mask+0.05: 41(-3.55,0) 42(3.55,0)
via -1.35,-0.563 diameter 0.6 hole 0.3
via -0.57,-0.563 diameter 0.6 hole 0.3
via 0.21,-0.564 diameter 0.6 hole 0.3
via 0.99,-0.564 diameter 0.6 hole 0.3
via 1.77,-0.565 diameter 0.6 hole 0.3
via 2.55,-0.565 diameter 0.6 hole 0.3
via 2.55,0.565 diameter 0.6 hole 0.3
via 1.77,0.565 diameter 0.6 hole 0.3
via 0.99,0.564 diameter 0.6 hole 0.3
via 0.21,0.564 diameter 0.6 hole 0.3
via -0.57,0.563 diameter 0.6 hole 0.3
via -1.35,0.563 diameter 0.6 hole 0.3
via 2.549,-1.342 diameter 0.6 hole 0.3
via 2.55,1.342 diameter 0.6 hole 0.3
Top Layer:
  region: -1.8,0.863 -1.8,-0.863 3.55,-0.863 3.55,0.863
  region: 2.25,1.645 2.25,-1.645 3.1,-1.645 3.1,1.645
Top Overlay:
  circle w0.25: c-4.25,-6.15 r0.125
Top Paste:
  region: -0.53,0.236 -1.76,0.236 -1.76,-0.239 -0.53,-0.239
  region: 2.53,0.239 1.3,0.239 1.3,-0.236 2.53,-0.236
  region: 1,0.238 -0.23,0.238 -0.23,-0.238 1,-0.238
  rectangle: -3.4,0.15 -2.87,1.62
  region: -3.7,1.62 -4.23,1.62 -4.23,0.15 -3.7,0.15
  region: -3.7,-0.15 -4.23,-0.15 -4.23,-1.62 -3.7,-1.62
  rectangle: -3.4,-1.62 -2.87,-0.15
  rectangle: 3.7,-1.62 4.23,-0.15
  region: 3.4,-0.15 2.87,-0.15 2.87,-1.62 3.4,-1.62
  region: 3.4,1.62 2.87,1.62 2.87,0.15 3.4,0.15
  rectangle: 3.7,0.15 4.23,1.62
Top Solder:
  region: -1.8,0.262 -1.8,-0.263 3.55,-0.262 3.55,0.262
Mechanical 13:
  lines w0.1: -5.075,-5.075 5.075,-5.075 5.075,5.075 -5.075,5.075 -5.075,-5.075
Mechanical 15:
  lines w0.05: -5.6,-5.6 5.6,-5.6 5.6,5.6 -5.6,5.6 -5.6,-5.6
  lines w0.1: -0.5,0 0.5,0 ; 0,-0.5 0,0.5
3D body: height 4.4, standoff 0, extent -5.075,-5.075 5.075,5.075
3D body: height 4.41, standoff 4.4, extent -4,-4 -3.5,-3.5

## MAX15027_T1033+1_V [mm] "SON, 10-Leads, Body 3x3mm, Pitch 0.5mm, Thermal Pad 2.35x1.58mm, Maxim Recommended"
height 0.8
pads (11):
  rect 0.7x0.3 smd mask+0.05: 1(-1.475,1) 2(-1.475,0.5) 3(-1.475,0) 4(-1.475,-0.5) 5(-1.475,-1) 6(1.475,-1) 7(1.475,-0.5) 8(1.475,0) 9(1.475,0.5) 10(1.475,1)
  rect 1.58x2.35 smd mask+0.05: 11(0,0)
via -0.49,0 diameter 0.5 hole 0.2
via 0,0.85 diameter 0.5 hole 0.2
via 0.49,0 diameter 0.5 hole 0.2
via 0,-0.85 diameter 0.5 hole 0.2
Top Overlay:
  circle w0.1: c-2.1,1.7 r0.05
  lines w0.2: -1.7,-1.55 -1.7,-1.7 -1.15,-1.7 ; -1.7,1.55 -1.7,1.7 -1.15,1.7 ; 1.15,-1.7 1.7,-1.7 1.7,-1.55 ; 1.15,1.7 1.7,1.7 1.7,1.55
Mechanical 13:
  circle w0.1: c-0.65,0.65 r0.5
  lines w0.1: -1.55,-1.55 -1.55,1.55 1.55,1.55 1.55,-1.55 -1.55,-1.55
Mechanical 15:
  lines w0.05: -1.925,-1.65 -1.925,1.65 1.925,1.65 1.925,-1.65 -1.925,-1.65
  lines w0.1: -0.5,0 0.5,0 ; 0,-0.5 0,0.5
3D body: height 0.8, standoff 0, extent -1.55,-1.55 1.55,1.55

## MOLEX_26-60-4020 [mm] "3.96mm (.156\") Pitch KK® Solid Header, Vertical, Friction Lock, 2 Circuits, Tin (Sn) Plating"
height 14.73
pads (2):
  round 2.4 hole 1.7: 1(-1.981,0) 2(1.981,0)
Top Overlay:
  circle w0.5: c-3.011,-2.2 r0.25
  lines w0.2: -3.886,4.089 3.886,4.089 ; -3.378,1.041 -3.378,4.089 ; -3.378,3.182 -3.886,3.182 -3.886,5.105 3.886,5.105 3.886,3.182 3.378,3.182 ; -2.917,1.041 -3.886,1.041 -3.886,-1.181 -2.733,-1.181 ; -1.981,-4.267 1.981,-4.267 ; -1.981,-2.548 1.981,-2.548 ; -1.981,-2.413 1.981,-2.413 ; -1.981,-1.4 -1.981,-4.902 1.981,-4.902 1.981,-1.4 ; 2.733,-1.181 3.886,-1.181 3.886,1.041 2.917,1.041 ; 3.378,1.041 3.378,4.089
  text "1" at -2.249,1.65 h1
Mechanical 4:
  lines w0.1: -3.937,-4.953 4.191,-4.953 4.191,5.08 -3.937,5.08 -3.937,-4.953
  text ".Designator" at -2.905,2.598 h1
3D body "MOLEX_26-60-4020.stp": height 14.73, standoff -3.56, extent -3.886,-4.902 3.886,5.106